# Altium footprint library 04.连接器件.pcb.PCBLIB: 363 footprints (part 19 of 23)
Each footprint in its own frame and in the unit in brackets; x right, y up, seen from the top. Pads: shape width x height; smd on the part's side, far side on the other; paste and mask are expansions set on the pad; w line width, h text height; cw(c..) or ccw(c..) is an arc to the next point about the centre after c.
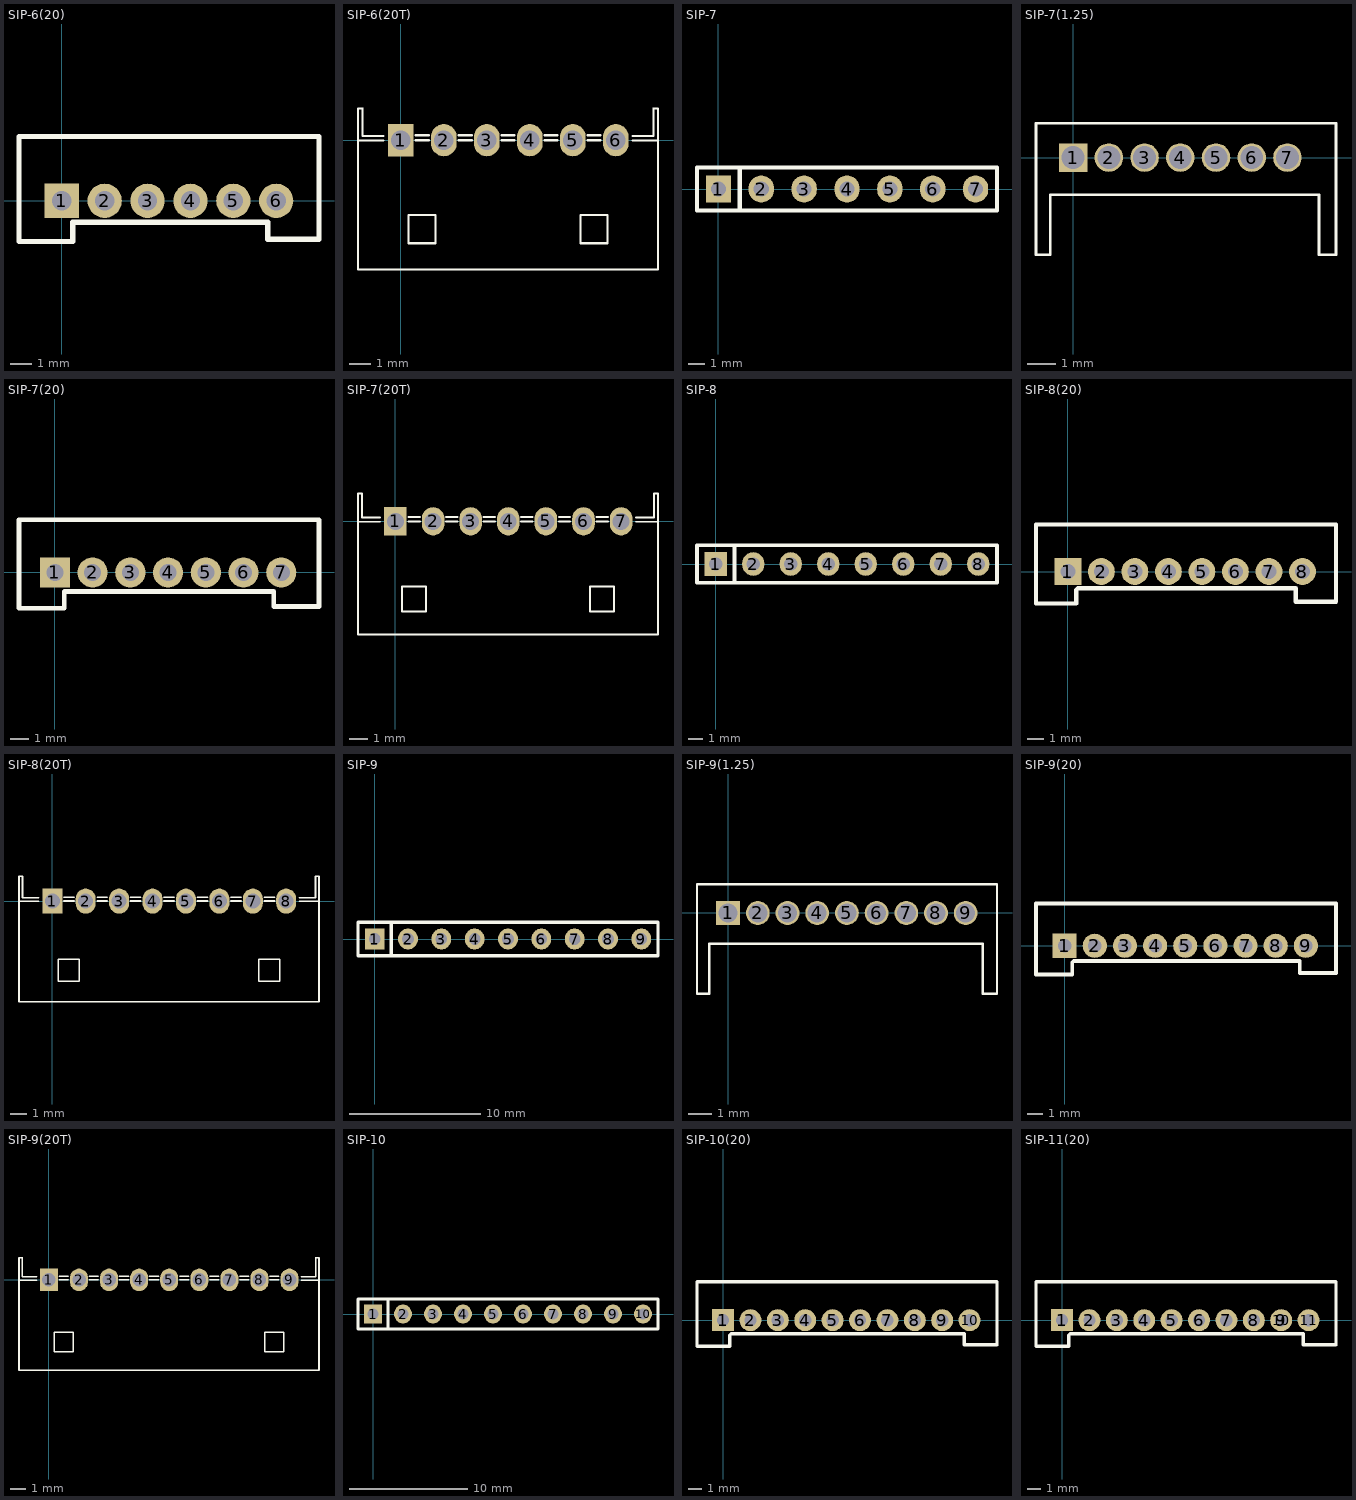
[diagram p18: the footprints below, top view; thin cyan lines are the x and y axes]

## SIP-6(20) [mm]
pads (6):
  rect 1.6x1.6 hole 0.9: 1(0,0)
  round 1.6 hole 0.9: 2(2,0) 3(4,0) 4(6,0) 5(8,0) 6(10,0)
TopOverlay:
  lines w0.254: -2,-1.9 -2,2.9 ; -2,3 12,3 12,-1.8 9.6,-1.8 9.6,-1 ; -1.9,-1.9 0.5,-1.9 0.5,-1 9.6,-1 ; 9.6,-1 9.6,-1

## SIP-6(20T) [mm]
pads (6):
  rect 1.2x1.5 hole 0.9: 1(0,0)
  oval 1.2x1.5 hole 0.9: 2(2,0) 3(4,0) 4(6,0) 5(8,0) 6(10,0)
TopOverlay:
  lines w0.1: -1.992,-0.02 -0.818,-0.02 ; -0.813,0.203 -1.778,0.203 -1.778,1.473 -1.785,1.48 -1.992,1.48 -1.992,-6.02 11.962,-6.02 11.962,1.48 11.755,1.48 11.748,1.473 11.748,0.203 10.783,0.203 ; 0.686,0 1.295,0 ; 0.686,0.229 1.295,0.229 ; 0.934,-4.795 1.62,-4.795 1.62,-3.474 0.934,-3.474 ; 1.036,-4.795 0.35,-4.795 0.35,-3.474 1.036,-3.474 ; 2.686,0 3.295,0 ; 2.686,0.229 3.295,0.229 ; 4.686,0 5.295,0 ; 4.686,0.229 5.295,0.229 ; 6.686,0 7.295,0 ; 6.686,0.229 7.295,0.229 ; 8.686,0 9.295,0 ; 8.686,0.229 9.295,0.229 ; 8.934,-4.795 9.62,-4.795 9.62,-3.474 8.934,-3.474 ; 9.036,-4.795 8.35,-4.795 8.35,-3.474 9.036,-3.474 ; 10.788,-0.02 11.962,-0.02

## SIP-7 [mm]
pads (7):
  rect 1.5x1.6 hole 0.9: 1(0,0)
  oval 1.5x1.6 hole 0.9: 2(2.54,0) 3(5.08,0) 4(7.62,0) 5(10.16,0) 6(12.7,0) 7(15.24,0)
TopOverlay:
  lines w0.254: 1.27,-1.27 1.27,1.27 ; -1.27,-1.27 16.51,-1.27 16.51,1.27 -1.27,1.27 -1.27,-1.27

## SIP-7(1.25) [mm]
pads (7):
  rect 1x1 hole 0.8: 1(0,0)
  round 1 hole 0.8: 2(1.25,0) 3(2.5,0) 4(3.75,0) 5(5,0) 6(6.25,0) 7(7.5,0)
TopOverlay:
  lines w0.1: -1.3,-3.4 -1.3,1.2 9.2,1.2 9.2,-3.4 8.6,-3.4 8.6,-1.3 -0.8,-1.3 -0.8,-3.4 -1.3,-3.4

## SIP-7(20) [mm]
pads (7):
  rect 1.6x1.6 hole 0.9: 1(0,0)
  round 1.6 hole 0.9: 2(2,0) 3(4,0) 4(6,0) 5(8,0) 6(10,0) 7(12,0)
TopOverlay:
  lines w0.254: -1.9,2.8 -1.9,-1.9 0.5,-1.9 0.5,-1 11.6,-1 ; -1.9,2.8 14,2.8 14,-1.8 ; -1.9,2.8 -1.9,2.8 ; 11.6,-1 11.6,-1 ; 11.6,-1 11.6,-1.8 14,-1.8 ; 11.6,-1 11.6,-1 ; 11.6,-1 11.6,-1 ; 14,-1.8 14,-1.8

## SIP-7(20T) [mm]
pads (7):
  rect 1.2x1.5 hole 0.9: 1(0,0)
  oval 1.2x1.5 hole 0.9: 2(2,0) 3(4,0) 4(6,0) 5(8,0) 6(10,0) 7(12,0)
TopOverlay:
  lines w0.1: -1.992,-0.02 -0.818,-0.02 ; -0.813,0.203 -1.778,0.203 -1.778,1.473 -1.785,1.48 -1.992,1.48 -1.992,-6.02 13.962,-6.02 13.962,1.48 13.755,1.48 13.748,1.473 13.748,0.203 12.783,0.203 ; 0.686,0 1.295,0 ; 0.686,0.229 1.295,0.229 ; 0.934,-4.795 1.62,-4.795 1.62,-3.474 0.934,-3.474 ; 1.036,-4.795 0.35,-4.795 0.35,-3.474 1.036,-3.474 ; 2.686,0 3.295,0 ; 2.686,0.229 3.295,0.229 ; 4.686,0 5.295,0 ; 4.686,0.229 5.295,0.229 ; 6.686,0 7.295,0 ; 6.686,0.229 7.295,0.229 ; 8.686,0 9.295,0 ; 8.686,0.229 9.295,0.229 ; 10.686,0 11.295,0 ; 10.686,0.229 11.295,0.229 ; 10.934,-4.795 11.62,-4.795 11.62,-3.474 10.934,-3.474 ; 11.036,-4.795 10.35,-4.795 10.35,-3.474 11.036,-3.474 ; 12.788,-0.02 13.962,-0.02

## SIP-8 [mm]
pads (8):
  rect 1.5x1.6 hole 0.9: 1(0,0)
  oval 1.5x1.6 hole 0.9: 2(2.54,0) 3(5.08,0) 4(7.62,0) 5(10.16,0) 6(12.7,0) 7(15.24,0) 8(17.78,0)
TopOverlay:
  lines w0.254: 1.27,-1.27 1.27,1.27 ; -1.27,-1.27 19.05,-1.27 19.05,1.27 -1.27,1.27 -1.27,-1.27

## SIP-8(20) [mm]
pads (8):
  rect 1.6x1.6 hole 0.9: 1(0,0)
  round 1.6 hole 0.9: 2(2,0) 3(4,0) 4(6,0) 5(8,0) 6(10,0) 7(12,0) 8(14,0)
TopOverlay:
  lines w0.254: 0.5,-1.1 0.5,-1.1 ; 0.5,-1.1 0.5,-1.9 -1.9,-1.9 -1.9,2.8 16,2.8 16,-1.8 ; 0.5,-1.1 0.6,-1 13.6,-1 ; 13.6,-1 13.6,-1 ; 13.6,-1 13.6,-1.8 16,-1.8 ; 13.6,-1 13.6,-1 ; 16,-1.8 16,-1.8

## SIP-8(20T) [mm]
pads (8):
  rect 1.2x1.5 hole 0.9: 1(0,0)
  oval 1.2x1.5 hole 0.9: 2(2,0) 3(4,0) 4(6,0) 5(8,0) 6(10,0) 7(12,0) 8(14,0)
TopOverlay:
  lines w0.1: -1.992,-0.02 -0.818,-0.02 ; -0.813,0.203 -1.778,0.203 -1.778,1.473 -1.785,1.48 -1.992,1.48 -1.992,-6.02 15.962,-6.02 15.962,1.48 15.755,1.48 15.748,1.473 15.748,0.203 14.783,0.203 ; 0.686,0 1.295,0 ; 0.686,0.229 1.295,0.229 ; 0.934,-4.795 1.62,-4.795 1.62,-3.474 0.934,-3.474 ; 1.036,-4.795 0.35,-4.795 0.35,-3.474 1.036,-3.474 ; 2.686,0 3.295,0 ; 2.686,0.229 3.295,0.229 ; 4.686,0 5.295,0 ; 4.686,0.229 5.295,0.229 ; 6.686,0 7.295,0 ; 6.686,0.229 7.295,0.229 ; 8.686,0 9.295,0 ; 8.686,0.229 9.295,0.229 ; 10.686,0 11.295,0 ; 10.686,0.229 11.295,0.229 ; 12.686,0 13.295,0 ; 12.686,0.229 13.295,0.229 ; 12.934,-4.795 13.62,-4.795 13.62,-3.474 12.934,-3.474 ; 13.036,-4.795 12.35,-4.795 12.35,-3.474 13.036,-3.474 ; 14.788,-0.02 15.962,-0.02

## SIP-9 [mm]
pads (9):
  rect 1.5x1.6 hole 0.9: 1(0,0)
  oval 1.5x1.6 hole 0.9: 2(2.54,0) 3(5.08,0) 4(7.62,0) 5(10.16,0) 6(12.7,0) 7(15.24,0) 8(17.78,0) 9(20.32,0)
TopOverlay:
  lines w0.254: 1.27,-1.27 1.27,1.27 ; -1.27,-1.27 21.59,-1.27 21.59,1.27 -1.27,1.27 -1.27,-1.27

## SIP-9(1.25) [mm]
pads (9):
  rect 1x1 hole 0.8: 1(0,0)
  round 1 hole 0.8: 2(1.25,0) 3(2.5,0) 4(3.75,0) 5(5,0) 6(6.25,0) 7(7.5,0) 8(8.75,0) 9(10,0)
TopOverlay:
  lines w0.1: -1.31,-3.389 -1.31,1.211 11.319,1.205 11.319,-3.395 10.719,-3.395 10.719,-1.295 -0.8,-1.3 -0.8,-3.4 -1.3,-3.4

## SIP-9(20) [mm]
pads (9):
  rect 1.6x1.6 hole 0.9: 1(0,0)
  round 1.6 hole 0.9: 2(2,0) 3(4,0) 4(6,0) 5(8,0) 6(10,0) 7(12,0) 8(14,0) 9(16,0)
TopOverlay:
  lines w0.254: 0.9,-1 0.6,-1 ; 0.5,-1.1 0.5,-1.1 ; 0.5,-1.1 0.5,-1.9 -1.9,-1.9 -1.9,2.8 18,2.8 18,-1.8 ; 0.5,-1.1 0.6,-1 ; 0.6,-1 15.6,-1 ; 15.6,-1 15.6,-1 ; 15.6,-1 15.6,-1.8 18,-1.8 ; 15.6,-1 15.6,-1 ; 18,-1.8 18,-1.8

## SIP-9(20T) [mm]
pads (9):
  rect 1.2x1.5 hole 0.9: 1(0,0)
  oval 1.2x1.5 hole 0.9: 2(2,0) 3(4,0) 4(6,0) 5(8,0) 6(10,0) 7(12,0) 8(14,0) 9(16,0)
TopOverlay:
  lines w0.1: -1.992,-0.02 -0.818,-0.02 ; -0.813,0.203 -1.778,0.203 -1.778,1.473 -1.785,1.48 -1.992,1.48 -1.992,-6.02 17.962,-6.02 17.962,1.48 17.755,1.48 17.748,1.473 17.748,0.203 16.783,0.203 ; 0.686,0 1.295,0 ; 0.686,0.229 1.295,0.229 ; 0.934,-4.795 1.62,-4.795 1.62,-3.474 0.934,-3.474 ; 1.036,-4.795 0.35,-4.795 0.35,-3.474 1.036,-3.474 ; 2.686,0 3.295,0 ; 2.686,0.229 3.295,0.229 ; 4.686,0 5.295,0 ; 4.686,0.229 5.295,0.229 ; 6.686,0 7.295,0 ; 6.686,0.229 7.295,0.229 ; 8.686,0 9.295,0 ; 8.686,0.229 9.295,0.229 ; 10.686,0 11.295,0 ; 10.686,0.229 11.295,0.229 ; 12.686,0 13.295,0 ; 12.686,0.229 13.295,0.229 ; 14.686,0 15.295,0 ; 14.686,0.229 15.295,0.229 ; 14.934,-4.795 15.62,-4.795 15.62,-3.474 14.934,-3.474 ; 15.036,-4.795 14.35,-4.795 14.35,-3.474 15.036,-3.474 ; 16.788,-0.02 17.962,-0.02

## SIP-10 [mm]
pads (10):
  rect 1.5x1.6 hole 0.9: 1(0,0)
  oval 1.5x1.6 hole 0.9: 2(2.54,0) 3(5.08,0) 4(7.62,0) 5(10.16,0) 6(12.7,0) 7(15.24,0) 8(17.78,0) 9(20.32,0) 10(22.86,0)
TopOverlay:
  lines w0.254: 1.27,-1.27 1.27,1.27 ; -1.27,-1.27 24.13,-1.27 24.13,1.27 -1.27,1.27 -1.27,-1.27

## SIP-10(20) [mm]
pads (10):
  rect 1.6x1.6 hole 0.9: 1(0,0)
  round 1.6 hole 0.9: 2(2,0) 3(4,0) 4(6,0) 5(8,0) 6(10,0) 7(12,0) 8(14,0) 9(16,0) 10(18,0)
TopOverlay:
  lines w0.254: 0.9,-1 0.6,-1 ; 0.5,-1.1 0.5,-1.1 ; 0.5,-1.1 0.5,-1.9 -1.9,-1.9 -1.9,2.8 18,2.8 20,2.8 20,-1.8 ; 0.5,-1.1 0.6,-1 ; 0.6,-1 15.6,-1 17.6,-1 ; 17.6,-1 17.6,-1 ; 17.6,-1 17.6,-1.8 20,-1.8 ; 17.6,-1 17.6,-1 ; 20,-1.8 20,-1.8

## SIP-11(20) [mm]
pads (11):
  rect 1.6x1.6 hole 0.9: 1(0,0)
  round 1.6 hole 0.9: 2(2,0) 3(4,0) 4(6,0) 5(8,0) 6(10,0) 7(12,0) 8(14,0) 9(16,0) 10(16,0) 11(18,0)
TopOverlay:
  lines w0.254: 0.5,-1.1 0.5,-1.1 ; 0.5,-1.1 0.5,-1.9 -1.9,-1.9 -1.9,2.8 20,2.8 20,-1.8 ; 0.5,-1.1 0.6,-1 0.9,-1 17.6,-1 ; 17.6,-1 17.6,-1 ; 17.6,-1 17.6,-1.8 20,-1.8 ; 17.6,-1 17.6,-1 ; 20,-1.8 20,-1.8